# Altium footprint library THU.PcbLib: 477 footprints (part 22 of 30)
Each footprint in its own frame and in the unit in brackets; x right, y up, seen from the top. Pads: shape width x height; smd on the part's side, far side on the other; paste and mask are expansions set on the pad; w line width, h text height; cw(c..) or ccw(c..) is an arc to the next point about the centre after c.
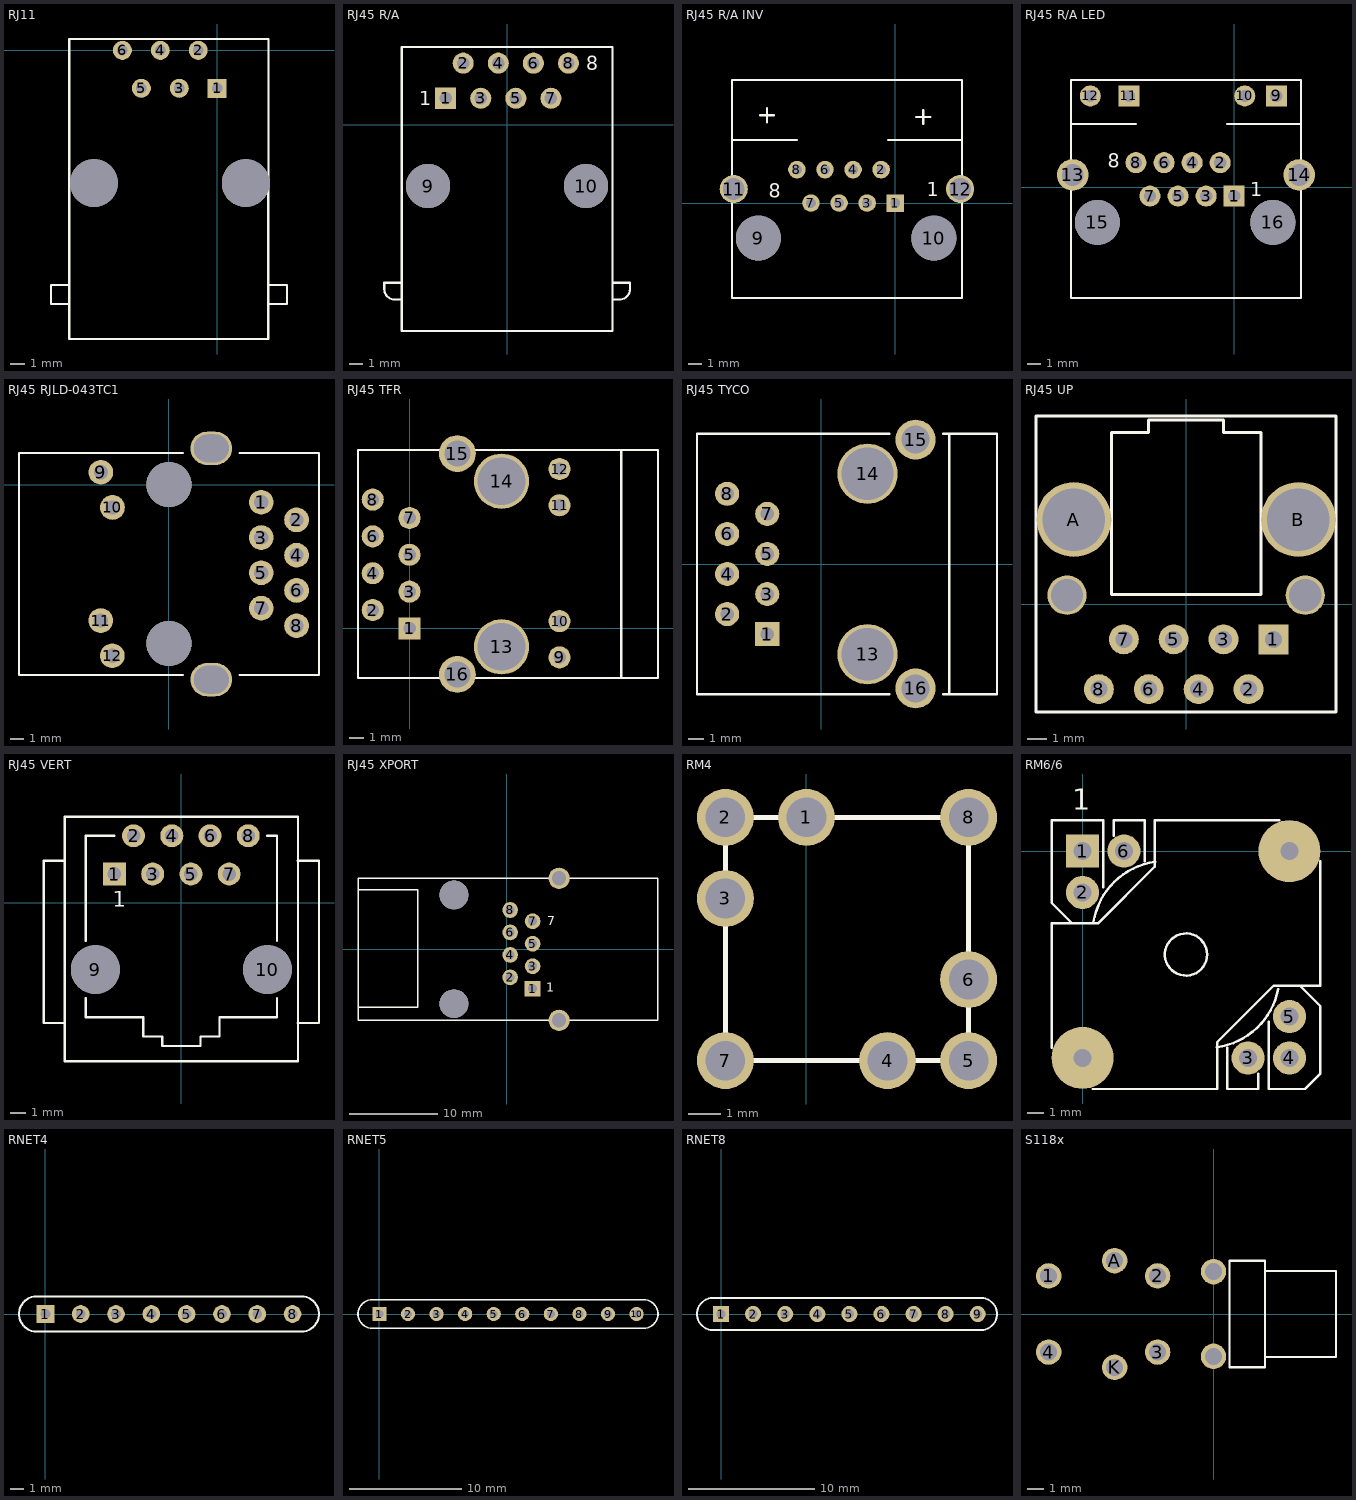
[diagram p21: the footprints below, top view; thin cyan lines are the x and y axes]

## RJ11 [mil]
pads (8):
  rect 50x50 hole 28: 1(0,-100)
  round 50 hole 28: 2(-50,0) 3(-100,-100) 4(-150,0) 5(-200,-100) 6(-250,0)
  round 125.98 hole 125.98 unplated: ""(-325,-350) ""(75,-350)
TopOverlay:
  lines w6: -390.35,-668.5 -438.39,-668.5 -438.39,-618.5 -389.57,-618.5 ; 135.24,-668.5 184.06,-668.5 184.06,-618.5 136.02,-618.5 ; -390,30 135,30 134.84,-761.02 -389.96,-761.02 -390,30

## RJ45 R/A [mil] "RIGHT ANGLE"
pads (10):
  rect 60x60 hole 35.43: 1(-175,75)
  round 60 hole 35.43: 2(-125,175) 3(-75,75) 4(-25,175) 5(25,75) 6(75,175) 7(125,75) 8(175,175)
  round 125.98 hole 125.98 unplated: 9(-225,-175) 10(225,-175)
TopOverlay:
  lines w6: -300,-498.51 -319.86,-498.51 cw(c-319.86,-468.38) -350,-468.38 -350,-450.59 -300,-450.59 ; 300,-498.51 319.86,-498.51 ccw(c319.86,-468.38) 350,-468.38 350,-450.59 300,-450.59 ; -300,-588.39 -300,221.46 300,221.46 300,-588.39 -300,-588.39
  text "1" at -250,55 h40
  text "8" at 260,155 h40
3D body: height 622.05, standoff 0, extent -300,-588.39 300,221.46

## RJ45 R/A INV [mil]
pads (12):
  rect 50x50 hole 28: 1(0,0)
  round 50 hole 28: 2(-40,95) 3(-80,0) 4(-120,95) 5(-160,0) 6(-200,95) 7(-240,0) 8(-280,95)
  round 128 hole 128 unplated: 9(-390,-100) 10(110,-100)
  round 80 hole 62 unplated: 11(-460,40) 12(185,40)
TopOverlay:
  lines w6: -465,180 -280,180 ; -385,250 -345,250 ; -365,230 -365,270 ; -20,180 190,180 ; 60,245 100,245 ; 80,225 80,265 ; -465,-270 -465,350 190,350 190,-270 -465,-270
  text "1" at 90,20 h40
  text "8" at -360,15 h40

## RJ45 R/A LED [mil]
pads (16):
  rect 60x60 hole 35: 1(0,-25) 9(120,260) 11(-300,260)
  round 60 hole 35: 2(-40,70) 3(-80,-25) 4(-120,70) 5(-160,-25) 6(-200,70) 7(-240,-25) 8(-280,70) 10(30,260) 12(-410,260)
  round 90 hole 62 unplated: 13(-460,35) 14(185,35)
  round 128 hole 128 unplated: 15(-390,-100) 16(110,-100)
TopOverlay:
  lines w6: -465,180 -280,180 ; -20,180 190,180 ; -465,-315 -465,305 190,305 190,-315 -465,-315
  text "1" at 45,-25 h40
  text "8" at -360,55 h40

## RJ45 RJLD-043TC1 [mil] "ETHERNET SOCKET + TRANSFORMER"
height 13.18
pads (16):
  round 70 hole 40: 1(261.81,-50) 2(361.81,-100) 3(261.81,-150) 4(361.81,-200) 5(261.81,-250) 6(361.81,-300) 7(261.81,-350) 8(361.81,-400) 9(-192.91,35.24) 10(-160,-64.76) 11(-193.35,-385.24) 12(-160.43,-485.24)
  round 128 hole 128 unplated: ""(0,-450) ""(0,0)
  oval 118.11x94.49 hole 78.74 slot 98.43 at 0 deg: ""(120,-552.95) ""(120,102.95)
TopOverlay:
  lines w6: 40,-540 -425,-540 -425,89.13 40,89.13 ; 200,-540 425.39,-540 425.39,89.13 200,89.13

## RJ45 TFR [mil]
pads (16):
  rect 60x60 hole 34: 1(0,0)
  round 60 hole 34: 2(-100,50) 3(0,100) 4(-100,150) 5(0,200) 6(-100,250) 7(0,300) 8(-100,350) 9(407.48,-78.74) 10(407.48,19.68) 11(407.48,334.65) 12(407.48,433.07)
  round 150 hole 130: 13(250,-50) 14(250,400)
  round 100 hole 70: 15(130,475) 16(130,-125)
TopOverlay:
  lines w6: 575,-130 575,485 ; -140,-135 -140,485 675,485 675,-135 -140,-135

## RJ45 TYCO [mil] "TYCO ELECTRONICS - 2-5338556-1 - RECEPTACLE, RJ45, PCB, 8WAY"
height 480.31
pads (12):
  rect 60x60 hole 34: 1(-134.91,-175)
  round 60 hole 34: 2(-234.91,-125) 3(-134.91,-75) 4(-234.91,-25) 5(-134.91,25) 6(-234.91,75) 7(-134.91,125) 8(-234.91,175)
  round 150 hole 130: 13(115.09,-225) 14(115.09,225)
  round 100 hole 70: 15(234.91,310.04) 16(234.91,-310.04)
TopOverlay:
  lines w6: 168.83,-324.8 -310.11,-324.8 -310.11,324.8 168.83,324.8 ; 304.03,-324.8 437.93,-324.8 437.93,0 437.93,324.8 304.03,324.8 ; 318.83,-324.8 318.83,324.8

## RJ45 UP [mil]
pads (12):
  rect 60x60 hole 34: 1(175,-70)
  round 60 hole 34: 2(125,-170) 3(75,-70) 4(25,-170) 5(-25,-70) 6(-75,-170) 7(-125,-70) 8(-175,-170)
  round 150 hole 125: A(-225,170) B(225,170)
  round 78.74 hole 64.96: ""(-238.78,18.43) ""(238.78,18.43)
TopOverlay:
  lines w6: -300.98,-215.28 300.39,-215.28 300.39,377.24 -300.98,377.24 -300.98,-215.28 ; -150,20 150,20 150,345 75,345 75,370 -75,370 -75,345 -150,345 -150,20

## RJ45 VERT [mil] "WURTH P/N: 615 008 144 211"
height 644.88
pads (10):
  rect 60x60 hole 35.43: 1(-175,75)
  round 60 hole 35.43: 2(-125,175) 3(-75,75) 4(-25,175) 5(25,75) 6(75,175) 7(125,75) 8(175,175)
  round 127.95 hole 127.95 unplated: 9(-225,-175) 10(225,-175)
TopOverlay:
  lines w6: -304.76,-314.76 -360,-314.76 -360,-307.64 -360,-102.4 -360,102.83 -360,109.96 -304.76,109.96 ; -250,-250 -250,-300 -100,-300 -100,-350 -50,-350 -50,-375 50,-375 50,-350 100,-350 100,-300 250,-300 250,-250 ; -250,-100 -250,175 -175,175 ; 225,175 250,175 250,-100 ; 304.76,-314.76 360,-314.76 360,-307.64 360,-102.4 360,102.83 360,109.96 304.76,109.96 ; -304.92,-415 305,-415 305,225 -304.92,225 -304.92,-415
  text "1" at -180,-10 h40
3D body: height 414.96, standoff 336.22, extent 305.12,-314.96 364.17,108.27
3D body: height 500, standoff 0, extent -305.12,-413.39 305.12,226.38
3D body: height 500, standoff 0, extent -246.06,-413.39 246.06,-295.28
3D body: height 157.48, standoff 0, extent -305.12,-413.39 305.12,226.38
3D body: height 414.96, standoff 336.22, extent -364.17,-314.96 -305.12,108.27

## RJ45 XPORT [mil]
pads (12):
  rect 70x70 hole 40: 1(116,-175)
  round 70 hole 40: 2(16,-125) 3(116,-75) 4(16,-25) 5(116,25) 6(16,75) 7(116,125) 8(16,175)
  round 127.99 hole 128 unplated: ""(-234,-242) ""(-234,242)
  round 94.49 hole 63: ""(234,-316) ""(234,316)
TopOverlay:
  lines w6: -661,-258 -398,-258 -396,-256 -396,264 -661,264 ; -661,-316 674,-316 674,316 -661,316 -661,-316
  text "7" at 181,107 h40
  text "1" at 176,-188 h40
3D body "XPort.STEP": height 554.86, standoff -132.66, extent -659.46,-358.28 687,340.28

## RM4 [mil]
pads (8):
  round 70 hole 49: 1(0,-1000) 2(-100,-1000) 3(-100,-1100) 4(100,-1300) 5(200,-1300) 6(200,-1200) 7(-100,-1300) 8(200,-1000)
TopOverlay:
  lines w6: -100,-1300 200,-1300 200,-1000 -100,-1000 -100,-1300

## RM6/6 [mil]
pads (8):
  rect 80x80 hole 43: 1(0,0)
  round 80 hole 43: 2(0,-100) 3(400,-500) 4(500,-500) 5(500,-400) 6(100,0)
  round 150 hole 43: ""(0,-500) ""(500,0)
TopOverlay:
  circle w6: c250,-250 r51
  lines w6: -75,-475 -75,-175 37,-175 174,-38 175,-37 ; -25,-175 -75,-125 -75,75 -62,75 50,75 50,-50 50,-88 ; 25,-575 325,-575 325,-462 462,-325 575,-325 575,-25 ; 26.17,-172.47 cw(c200,-200) 175.51,-25.71 ; 75,37 75,75 150,75 150,-25 ; 175,-38 175,75 475,75 ; 324.49,-474.29 ccw(c300,-300) 472.77,-333.58 ; 350,-475 350,-575 425,-575 425,-538 ; 450,-413 450,-575 538,-575 575,-538 575,-513 575,-375 525,-325
  text "1" at -25,100 h50
BottomOverlay:
  text "1" at -50,-25 h52
  text "2" at 25,-200 h52
  text "3" at 350,-525 h52
  text "4" at 600,-525 h52
  text "5" at 525,-350 h52
  text "6" at 200,-25 h52

## RNET4 [mil]
pads (8):
  rect 50x50 hole 28: 1(0,0)
  round 50 hole 28: 2(100,0) 3(200,0) 4(300,0) 5(400,0) 6(500,0) 7(600,0) 8(700,0)
TopOverlay:
  lines w6: -25,-50 cw(c-25,0) -25,50 725,50 cw(c725,0) 725,-50 -25,-50

## RNET5 [mil]
pads (10):
  rect 50x50 hole 28: 1(0,0)
  round 50 hole 28: 2(100,0) 3(200,0) 4(300,0) 5(400,0) 6(500,0) 7(600,0) 8(700,0) 9(800,0) 10(900,0)
TopOverlay:
  lines w6: -25,-50 cw(c-25,0) -25,50 925,50 cw(c925,0) 925,-50 -25,-50

## RNET8 [mil]
pads (9):
  rect 50x50 hole 28: 1(0,0)
  round 50 hole 28: 2(100,0) 3(200,0) 4(300,0) 5(400,0) 6(500,0) 7(600,0) 8(700,0) 9(800,0)
TopOverlay:
  lines w6: -25,-50 810,-50 ccw(c810,0) 810,50 -25,50 ccw(c-25,0) -25,-50

## S118x [mm] "SPST LED 90 Deg. Metallic Round Tactile Switch"
height 7
pads (8):
  round 1.5 hole 1: 1(-9.74,2.25) 2(-3.3,2.25) 3(-3.3,-2.25) 4(-9.74,-2.25) A(-5.84,3.15) K(-5.84,-3.15) ""(0,-2.5) ""(0,2.5)
TopOverlay:
  lines w0.127: 3.047,-2.54 7.239,-2.54 7.239,2.54 3.047,2.54 ; 0.947,-3.15 0.947,0 0.947,3.15 3.047,3.15 3.047,0 3.047,-3.15 0.947,-3.15